# Altium footprint library Apalis Evaluation Board.PcbLib: 212 footprints (part 5 of 14)
Each footprint in its own frame and in the unit in brackets; x right, y up, seen from the top. Pads: shape width x height; smd on the part's side, far side on the other; paste and mask are expansions set on the pad; w line width, h text height; cw(c..) or ccw(c..) is an arc to the next point about the centre after c.
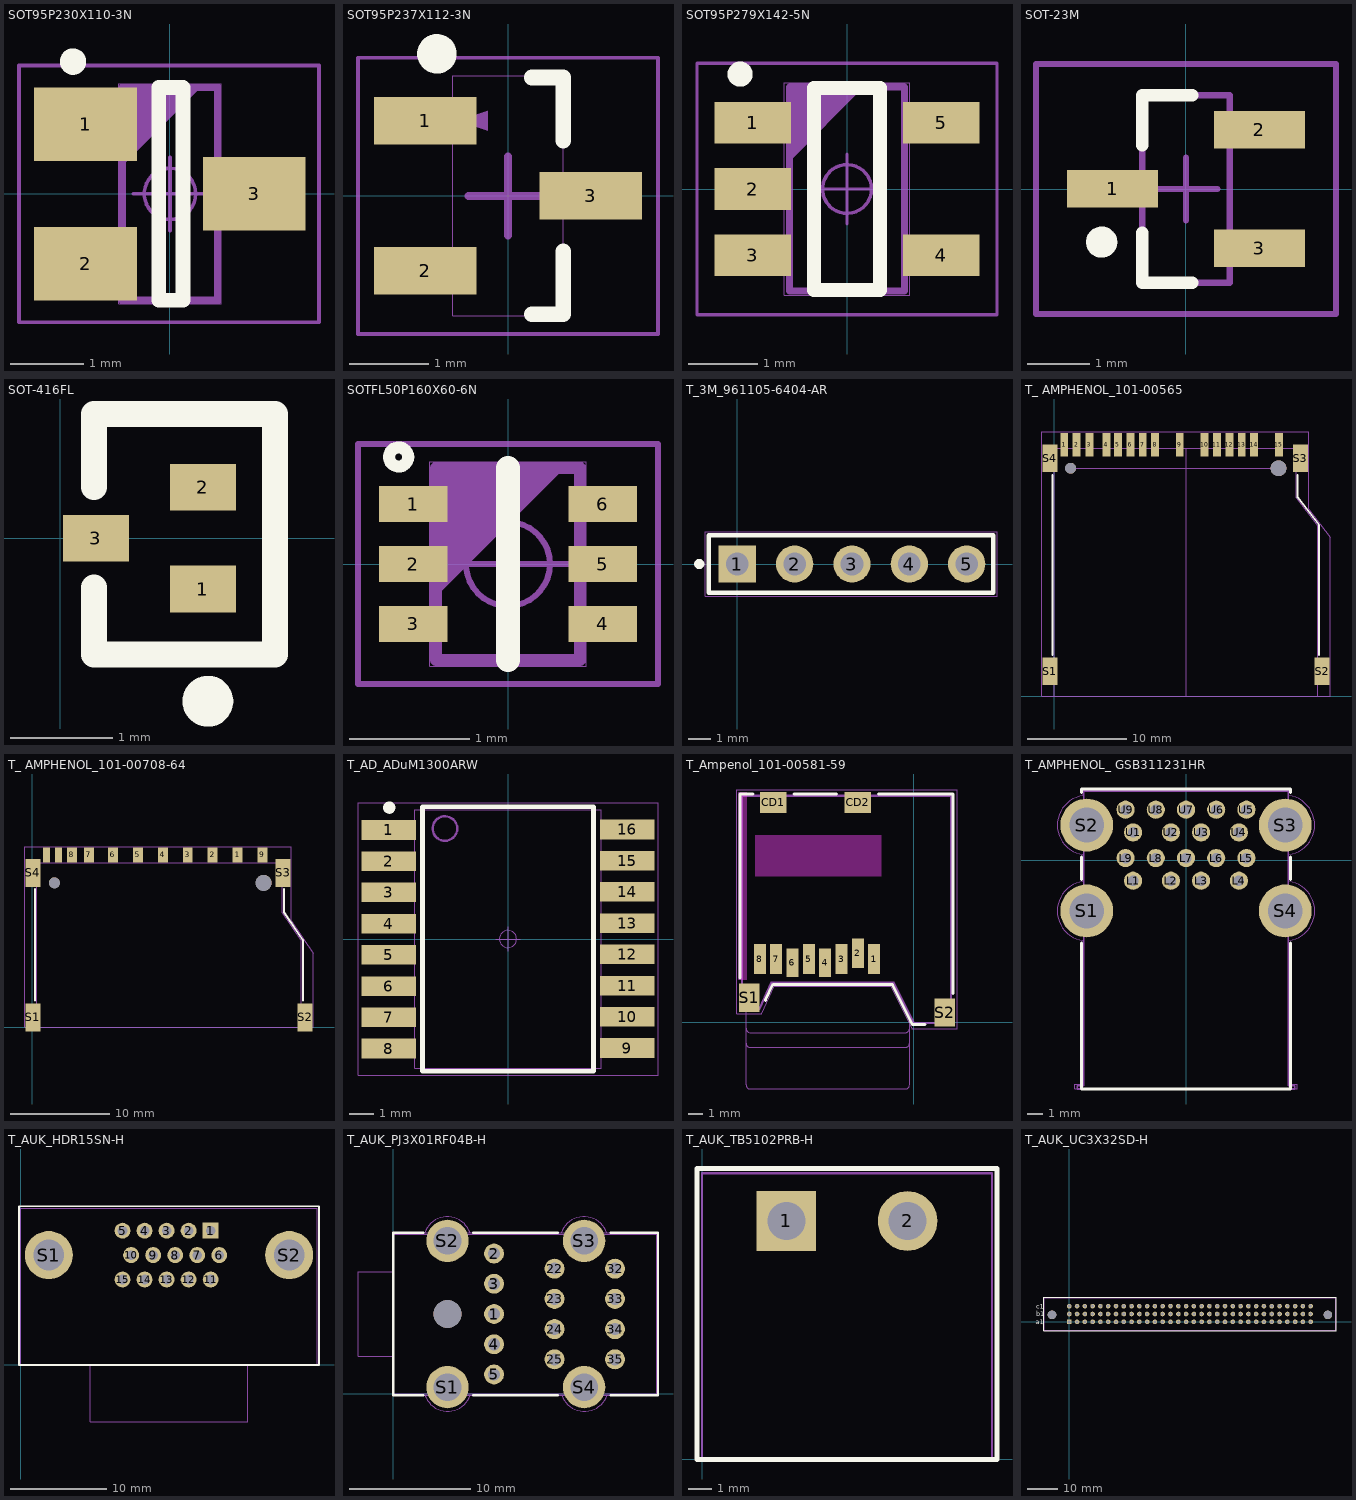
[diagram p4: the footprints below, top view; thin cyan lines are the x and y axes]

## SOT95P230X110-3N [mm] "SOT-23-3L"
height 1.12
pads (3):
  rect 1.4x1 smd: 1(-1.15,0.95) 2(-1.15,-0.95) 3(1.15,0)
Top Overlay:
  circle w0.2: c-1.321,1.803 r0.08
  lines w0.2: -0.152,-1.45 0.178,-1.45 0.178,1.45 -0.152,1.45 -0.152,-1.45
Mechanical 1:
  circle w0.05: c0,0 r0.35
  lines w0.05: -0.5,0 0.5,0 ; 0,-0.5 0,0.5 ; -2.057,-1.75 2.032,-1.75 2.032,1.75 -2.057,1.75 -2.057,-1.75
Mechanical 2:
  lines w0.001: -0.7,-1.5 0.7,-1.5 0.7,1.5 -0.7,1.5 -0.7,-1.5
Mechanical 3:
  lines w0.1: -0.65,0.45 0.35,1.45 ; -0.65,0.55 0.25,1.45 ; -0.65,0.65 0.15,1.45 ; -0.65,0.75 0.05,1.45 ; -0.65,0.85 -0.05,1.45 ; -0.65,0.95 -0.15,1.45 ; -0.65,1.05 -0.25,1.45 ; -0.65,1.15 -0.35,1.45 ; -0.65,1.25 -0.45,1.45 ; -0.65,1.35 -0.55,1.45 ; -0.65,-1.45 0.65,-1.45 0.65,1.45 -0.65,1.45 -0.65,-1.45
3D body: height 1.12, standoff 0, extent -0.7,-1.5 0.7,1.5

## SOT95P237X112-3N [mm] "SOT23, 3-Leads, Body 3.0x2.6mm (max), Pitch 0.95mm, IPC Medium Density"
height 1.12
pads (3):
  rect 1.3x0.6 smd: 1(-1.05,0.95) 2(-1.05,-0.95) 3(1.05,0)
Top Overlay:
  circle w0.25: c-0.9,1.8 r0.125
  lines w0.2: 0.3,-1.5 0.7,-1.5 0.7,-0.7 ; 0.3,1.5 0.7,1.5 0.7,0.7
Mechanical 1:
  lines w0.05: -1.9,-1.75 -1.9,1.75 1.9,1.75 1.9,-1.75 -1.9,-1.75
Mechanical 2:
  lines w0.001: -0.7,-1.52 0.7,-1.52 0.7,1.52 -0.7,1.52 -0.7,-1.52
Mechanical 3:
  region: -0.635,0.95 -0.254,1.077 -0.254,0.823
  lines w0.1: -0.5,0 0.5,0 ; 0,-0.5 0,0.5
3D body: height 1.12, standoff 0.2, extent -0.7,-1.52 0.7,1.52

## SOT95P279X142-5N [mm]
height 1.1
pads (5):
  rect 1.1x0.6 smd: 1(-1.35,0.95) 2(-1.35,0) 3(-1.35,-0.95) 4(1.35,-0.95) 5(1.35,0.95)
Top Overlay:
  circle w0.2: c-1.533,1.646 r0.08
  lines w0.2: -0.475,-1.45 0.475,-1.45 0.475,1.45 -0.475,1.45 -0.475,-1.45
Mechanical 1:
  circle w0.05: c0,0 r0.35
  lines w0.05: -0.5,0 0.5,0 ; 0,-0.5 0,0.5 ; -2.15,-1.8 2.15,-1.8 2.15,1.8 -2.15,1.8 -2.15,-1.8
Mechanical 2:
  lines w0.001: -0.9,-1.52 0.9,-1.52 0.9,1.52 -0.9,1.52 -0.9,-1.52
Mechanical 3:
  lines w0.1: -0.825,0.46 0.175,1.46 ; -0.825,0.56 0.075,1.46 ; -0.825,0.66 -0.025,1.46 ; -0.825,0.76 -0.125,1.46 ; -0.825,0.86 -0.225,1.46 ; -0.825,0.96 -0.325,1.46 ; -0.825,1.06 -0.425,1.46 ; -0.825,1.16 -0.525,1.46 ; -0.825,1.26 -0.625,1.46 ; -0.825,1.36 -0.725,1.46 ; -0.825,-1.46 0.825,-1.46 0.825,1.46 -0.825,1.46 -0.825,-1.46
3D body: height 1.1, standoff 0, extent -0.9,-1.52 0.9,1.52

## SOT-23M [mm]
pads (3):
  rect 1.45x0.6 smd: 1(-1.175,0) 2(1.175,0.95) 3(1.175,-0.95)
Top Overlay:
  circle w0.25: c-1.35,-0.85 r0.125
  lines w0.2: -0.7,-0.7 -0.7,-1.5 0.1,-1.5 ; -0.7,0.7 -0.7,1.5 0.1,1.5
Mechanical 13:
  lines w0.1: -0.7,-1.5 -0.7,1.5 0.7,1.5 0.7,-1.5 -0.7,-1.5
Mechanical 15:
  lines w0.1: -0.5,0 0.5,0 ; 0,-0.5 0,0.5 ; -2.4,-2 -2.4,2 2.4,2 2.4,-2 -2.4,-2
3D body: height 1.1, standoff 0, extent -0.7,-1.5 0.7,1.5

## SOT-416FL [mm] "DTC043ZEBTL"
height 0.85
pads (3):
  rect 0.65x0.46 smd: 1(1.4,-0.5) 2(1.4,0.5) 3(0.35,0)
Top Overlay:
  circle w0.25: c1.448,-1.6 r0.125
  lines w0.254: 0.33,-0.483 0.33,-1.143 2.108,-1.143 2.108,1.219 0.33,1.219 0.33,0.5

## SOTFL50P160X60-6N [mm] "SOT-563"
height 0.6
pads (6):
  rect 0.57x0.3 smd: 1(-0.79,0.5) 2(-0.79,0) 3(-0.79,-0.5) 4(0.79,-0.5) 5(0.79,0) 6(0.79,0.5)
Top Overlay:
  circle w0.1: c-0.911,0.892 r0.08
  lines w0.2: 0,-0.8 0,0.8
Mechanical 1:
  circle w0.05: c0,0 r0.35
  lines w0.05: -0.5,0 0.5,0 ; 0,-0.5 0,0.5 ; -1.25,-1 -1.25,1 1.25,1 1.25,-1 -1.25,-1
Mechanical 2:
  lines w0.001: -0.65,-0.85 -0.65,0.85 0.65,0.85 0.65,-0.85 -0.65,-0.85
Mechanical 3:
  lines w0.1: -0.6,-0.2 0.4,0.8 ; -0.6,-0.1 0.3,0.8 ; -0.6,0 0.2,0.8 ; -0.6,0.1 0.1,0.8 ; -0.6,0.2 0,0.8 ; -0.6,0.3 -0.1,0.8 ; -0.6,0.4 -0.2,0.8 ; -0.6,0.5 -0.3,0.8 ; -0.6,0.6 -0.4,0.8 ; -0.6,0.7 -0.5,0.8 ; -0.6,-0.8 -0.6,0.8 0.6,0.8 0.6,-0.8 -0.6,-0.8
3D body: height 0.6, standoff 0, extent -0.65,-0.85 0.65,0.85

## T_3M_961105-6404-AR [mm] "Connector; Header; 35 Position"
height 8.4
pads (5):
  rect 1.65x1.65 hole 1: 1(0,0)
  round 1.65 hole 1: 2(2.54,0) 3(5.08,0) 4(7.62,0) 5(10.16,0)
Top Overlay:
  circle w0.25: c-1.687,0 r0.1
  lines w0.2: -1.27,-1.27 -1.27,1.27 11.344,1.27 11.344,-1.27 -1.27,-1.27
Mechanical 1:
  lines w0.05: -1.43,-1.43 11.504,-1.43 11.504,1.43 -1.43,1.43 -1.43,-1.43
Mechanical 2:
  lines w0.001: -1.27,-1.27 -1.27,1.27 11.344,1.27 11.344,-1.27 -1.27,-1.27
Mechanical 3:
  lines w0.1: -1.27,-1.27 -1.27,1.27 11.344,1.27 11.344,-1.27 -1.27,-1.27
3D body "Samtec-TSW-105-07-G-S, Jumper with 5 pins, male.step": height 8.4, standoff -2.52, extent -1.27,-1.27 11.43,1.27

## T_ AMPHENOL_101-00565 [mm] "SD/MMC 8bit Card Holder"
height 2.85
pads (21):
  rect 0.8x2.35 smd: 1(1,25.375) 2(2.25,25.375) 3(3.55,25.375) 4(5.25,25.375) 5(6.43,25.375) 6(7.68,25.375) 7(8.93,25.375) 8(10.18,25.375) 9(12.67,25.375) 10(15.18,25.375) 11(16.43,25.375) 12(17.68,25.375) 13(18.93,25.375) 14(20.18,25.375) 15(22.68,25.375)
  rect 1.5x2.8 smd: S1(-0.45,2.5) S2(27.05,2.5) S3(24.86,24) S4(-0.45,24)
  round 1.1 hole 1.1 unplated: ""(1.65,23)
  round 1.6 hole 1.6 unplated: ""(22.65,23)
Top Overlay:
  lines w0.2: -0.2,4.125 -0.2,22.345 ; 24.575,22.345 24.575,20.055 26.755,17.268 26.755,4.125
Mechanical 1:
  lines w0.05: -1.29,0 -1.29,26.665 25.7,26.665 25.7,18.856 27.89,16.056 27.89,0 -1.29,0
Mechanical 2:
  lines w0.01: 0,1.5 -0.7,1.5 -0.7,3.5 0,3.5 ; 0,23 -0.7,23 -0.7,25 -0.11,25 24.41,25 ; 0,25 0,0 26.6,0 26.6,17.2 24.41,20 24.41,25 ; 1.65,23 22.65,23 ; 13.3,0 13.3,25 ; 24.41,23 25.11,23 25.11,25 24.41,25 ; 26.6,1.5 27.3,1.5 27.3,3.5 26.6,3.5
Mechanical 3:
  lines w0.1: 0,0 26.6,0 26.6,17.2 24.41,20 24.41,25 0,25 0,0
3D body: height 0.6, standoff 0, extent 24.41,23 25.11,25
3D body: height 0.6, standoff 0, extent -0.7,1.5 0,3.5
3D body: height 0.6, standoff 0, extent 26.6,1.5 27.3,3.5
3D body: height 3.45, standoff 0, extent 0,0 26.6,25
3D body: height 0.6, standoff 0, extent -0.7,23 0,25

## T_ AMPHENOL_101-00708-64 [mm] "SD/MMC Card Holder"
height 2.85
pads (17):
  rect 1x1.5 smd: 1(20.59,17.3) 2(18.09,17.3) 3(15.59,17.3) 4(13.09,17.3) 5(10.59,17.3) 6(8.09,17.3) 7(5.67,17.3) 8(3.97,17.3) 9(23.09,17.3)
  rect 0.7x1.5 smd: 10(2.63,17.3) 11(1.43,17.3)
  rect 1.5x2.8 smd: S1(0.06,1) S2(27.36,1) S3(25.16,15.5) S4(0.06,15.5)
  round 1.1 hole 1.1 unplated: ""(2.21,14.5)
  round 1.6 hole 1.6 unplated: ""(23.21,14.5)
Top Overlay:
  lines w0.2: 0.25,2.68 0.25,13.88 ; 25.255,13.88 25.255,11.552 27.14,8.759 27.14,2.68
Mechanical 1:
  lines w0.05: -0.775,0 28.195,0 28.195,7.45 26,10.702 26,18.125 -0.775,18.125 -0.775,0
Mechanical 2:
  lines w0.001: 0.45,0 0,0 0,2 0.45,2 ; 0.45,14.5 0,14.5 0,16.5 0.45,16.5 ; 25.08,14.5 25.5,14.5 25.5,16.5 25.08,16.5 ; 26.97,0 27.39,0 27.39,2 26.97,2
  lines w0.01: 0.45,0 0.45,16.5 25.08,16.5 25.08,11.5 26.97,8.7 26.97,0 0.45,0
Mechanical 3:
  lines w0.1: 0.45,0 26.97,0 26.97,8.7 25.08,11.5 25.08,16.5 0.45,16.5 0.45,0
3D body: height 0.6, standoff 0, extent 26.97,0 27.39,2
3D body: height 0.6, standoff 0, extent 0,0 0.45,2
3D body: height 0.6, standoff 0, extent 0,14.5 0.45,16.5
3D body: height 0.6, standoff 0, extent 25.08,14.5 25.5,16.5
3D body: height 2.85, standoff 0, extent 0.45,0 26.97,16.5

## T_AD_ADuM1300ARW [mm] "SOIC _W 16 pin"
height 2.65
pads (16):
  rect 2.2x0.8 smd: 1(-4.85,4.435) 2(-4.85,3.165) 3(-4.85,1.895) 4(-4.85,0.625) 5(-4.85,-0.645) 6(-4.85,-1.915) 7(-4.85,-3.185) 8(-4.85,-4.455) 9(4.85,-4.435) 10(4.85,-3.165) 11(4.85,-1.895) 12(4.85,-0.625) 13(4.85,0.645) 14(4.85,1.915) 15(4.85,3.185) 16(4.85,4.455)
Top Overlay:
  circle w0.25: c-4.829,5.343 r0.125
  lines w0.2: 3.481,-5.378 -3.481,-5.378 -3.481,5.377 3.481,5.377 3.481,-5.377
Mechanical 1:
  circle w0.05: c0,0 r0.35
  lines w0.05: -0.5,0 0.5,0 ; 0,-0.5 0,0.5 ; -6.1,-5.536 -6.1,5.535 6.1,5.535 6.1,-5.536 -6.1,-5.536
Mechanical 2:
  lines w0.001: -3.8,-5.25 3.8,-5.25 3.8,5.25 -3.8,5.25 -3.8,-5.25
Mechanical 3:
  circle w0.1: c-2.565,4.493 r0.5
  lines w0.1: -3.481,-5.378 3.481,-5.378 3.481,5.377 -3.481,5.377 -3.481,-5.378
3D body: height 2.65, standoff 0, extent -3.8,-5.25 3.8,5.25

## T_Ampenol_101-00581-59 [mm] "MicroSD Holder top-loading type"
height 1.8
pads (12):
  rect 0.8x2 smd: 1(-2.67,4.25) 2(-3.77,4.65) 3(-4.87,4.25) 5(-7.07,4.25) 7(-9.27,4.25) 8(-10.37,4.25)
  rect 0.8x1.9 smd: 4(-5.97,4) 6(-8.17,4)
  rect 1.8x1.4 smd: CD1(-9.47,14.8) CD2(-3.77,14.8)
  rect 1.4x1.9 smd: S1(-11.08,1.65) S2(2.08,0.65)
Top Overlay:
  lines w0.2: -11.697,2.96 -11.697,15.366 -10.839,15.366 ; -9.998,1.461 -9.496,2.549 -1.448,2.549 -0.105,-0.167 0.753,-0.167 ; -8.055,15.366 -5.197,15.366 ; -2.39,15.366 2.636,15.366 2.636,1.928
Keep-Out Layer:
  rectangle: -11.83,2.854 -11.23,15.5
  rectangle: -10.68,9.8 -2.18,12.6
Mechanical 1:
  lines w0.05: -11.916,0.564 -10.253,0.564 -9.403,2.407 -1.54,2.407 -0.135,-0.436 2.916,-0.436 2.916,15.636 -11.916,15.636 -11.916,0.564
Mechanical 2:
  lines w0.001: -11.29,-1.425 ccw(c-11.015,-1.425) -11.015,-1.7 -0.565,-1.7 ccw(c-0.565,-1.425) -0.29,-1.425 ; -11.29,-0.428 -11.29,-4.225 ccw(c-11.015,-4.225) -11.015,-4.5 -0.565,-4.5 ccw(c-0.565,-4.225) -0.29,-4.225 -0.29,-0.425 ; -11.29,0.95 -11.29,-0.425 ccw(c-11.015,-0.425) -11.015,-0.7 -0.565,-0.7 ccw(c-0.565,-0.425) -0.29,-0.425 ; -0.29,0.586 -0.29,-0.425 ; -11.53,0.95 -11.53,15.2 2.47,15.2 2.47,0 0,0 -1.346,2.721 -9.608,2.721 -10.424,0.95 -11.53,0.95
Mechanical 3:
  lines w0.1: -10.38,0.876 -11.596,0.876 -11.596,15.266 2.529,15.266 ; -10.379,0.878 -9.563,2.649 ; -9.56,2.649 -1.384,2.649 ; -1.383,2.649 -0.041,-0.066 ; -0.038,-0.068 2.538,-0.068 ; 2.535,-0.045 2.535,15.265 2.529,15.265 ; 2.529,15.265 2.529,15.266

## T_AMPHENOL_ GSB311231HR [mm] "USB 3.0 double row, Type A"
height 15.5
pads (22):
  round 1.2 hole 0.7: L1(-3.5,-1.35) L2(-1,-1.35) L3(1,-1.35) L4(3.5,-1.35) L5(4,0.15) L6(2,0.15) L7(0,0.15) L8(-2,0.15) L9(-4,0.15) U1(-3.5,1.85) U2(-1,1.85) U3(1,1.85) U4(3.5,1.85) U5(4,3.35) U6(2,3.35) U7(0,3.35) U8(-2,3.35) U9(-4,3.35)
  round 3.5 hole 2.3: S1(-6.57,-3.35) S2(-6.57,2.33) S3(6.57,2.33) S4(6.57,-3.35)
Top Overlay:
  lines w0.2: -6.9,-5.48 -6.9,-15.13 6.9,-15.13 6.9,-5.48 ; -6.9,-1.28 -6.9,0.22 ; -6.9,4.5 -6.9,4.72 6.9,4.72 6.9,4.5 ; 6.9,-1.28 6.9,0.22
Mechanical 1:
  lines w0.05: -6.809,-5.293 -6.809,-14.83 -7.349,-14.83 -7.349,-15.13 7.349,-15.13 7.349,-14.83 6.81,-14.83 6.809,-5.292 ; -6.809,-1.405 -6.809,0.385 ; -6.809,-5.293 cw(c-6.565,-3.351) -6.809,-1.408 ; -6.809,0.387 cw(c-6.565,2.329) -6.809,4.272 -6.809,4.63 6.809,4.63 6.809,4.273 ; 6.809,-5.292 ccw(c6.565,-3.349) 6.809,-1.407 ; 6.809,0.388 ccw(c6.565,2.331) 6.809,4.273 ; 6.809,-1.405 6.809,0.385
Mechanical 2:
  lines w0.001: -6.753,4.57 6.747,4.57 ; -6.75,4.57 -6.75,-14.93 -7.2,-14.93 -7.2,-15.13 7.2,-15.13 7.2,-14.93 6.75,-14.93 6.75,4.57
Mechanical 3:
  lines w0.1: -7.2,-15.13 -7.2,-14.93 -6.75,-14.93 -6.75,4.57 6.75,4.57 6.75,-14.93 7.2,-14.93 7.2,-15.13 -7.2,-15.13

## T_AUK_HDR15SN-H [mm] "15 pin male D-SUB connector"
height 12.55
pads (17):
  rect 1.65x1.65 hole 1: 1(19.73,13.97)
  round 1.65 hole 1: 2(17.44,13.97) 3(15.15,13.97) 4(12.86,13.97) 5(10.57,13.97) 6(20.62,11.43) 7(18.33,11.43) 8(16.04,11.43) 9(13.75,11.43) 10(11.46,11.43) 11(19.73,8.89) 12(17.44,8.89) 13(15.15,8.89) 14(12.86,8.89) 15(10.57,8.89)
  round 5 hole 3.2: S1(2.9,11.43) S2(27.9,11.43)
Top Overlay:
  lines w0.2: -0.2,0 -0.2,16.505 31,16.505 31,0 -0.2,0
Mechanical 1:
  lines w0.05: 0,0 0,16.3 30.8,16.3 30.8,0 0,0
Mechanical 2:
  lines w0.001: 7.235,0 7.235,-5.9 23.565,-5.9 23.565,0 ; 30.8,0 30.8,16.3 0,16.3 0,0 30.819,0
Mechanical 3:
  lines w0.1: 0,0 30.8,0 30.8,16.3 0,16.3 0,0
3D body "VGA connector_mod2.STEP": height 12.6, standoff -3.17, extent -0.006,-5.893 30.81,16.231

## T_AUK_PJ3X01RF04B-H [mm] "Audio Jack Triple Stacked DIP Type"
height 37
pads (18):
  round 1.65 hole 1: 1(8.35,6.6) 2(8.35,11.6) 3(8.35,9.1) 4(8.35,4.1) 5(8.35,1.6) 22(13.35,10.35) 23(13.35,7.85) 24(13.35,5.35) 25(13.35,2.85) 32(18.35,10.35) 33(18.35,7.85) 34(18.35,5.35) 35(18.35,2.85)
  round 3.5 hole 2.3: S1(4.5,0.55) S2(4.5,12.65) S3(15.8,12.65) S4(15.8,0.55)
  round 2.3 hole 2.3 unplated: ""(4.5,6.6)
Top Overlay:
  lines w0.2: 0,-0.105 2.5,-0.105 ; 0,-0.082 0,13.305 2.5,13.305 ; 6.625,-0.105 13.625,-0.105 ; 6.625,13.305 13.625,13.305 ; 18,-0.105 21.903,-0.105 21.905,-0.105 21.905,13.305 18,13.305
Mechanical 1:
  lines w0.05: 2.604,13.299 cw(c4.484,12.666) 6.363,13.301 ; 2.604,13.3 0,13.3 0,-0.1 2.637,-0.1 ; 2.637,-0.101 ccw(c4.516,0.533) 6.396,-0.099 ; 6.363,13.3 13.904,13.3 ; 6.396,-0.1 13.937,-0.1 ; 13.904,13.299 cw(c15.784,12.666) 17.663,13.301 ; 13.937,-0.101 ccw(c15.816,0.533) 17.696,-0.099 ; 17.663,13.3 21.9,13.3 21.9,-0.1 17.696,-0.1
Mechanical 2:
  lines w0.001: 0,3.1 -2.9,3.1 -2.9,10.1 0,10.1 ; 0,0 0,13.2 21.8,13.2 21.8,0 0,0
Mechanical 3:
  lines w0.1: 0,-0.1 21.901,-0.1 ; 0,13.3 21.9,13.3 21.902,13.298 21.902,-0.1 ; 0.001,-0.074 0.001,13.326 ; 21.901,-0.1 21.902,-0.1
3D body: height 31.5, standoff 28.5, extent -2.905,5.105 0.01,8.093
3D body: height 19, standoff 16, extent -2.905,5.105 0.01,8.093
3D body: height 6.5, standoff 3.5, extent -2.905,5.105 0.01,8.093
3D body: height 21.01, standoff 13.99, extent -2.9,3.1 0,10.1
3D body: height 33.51, standoff 26.49, extent -2.9,3.1 0,10.1
3D body: height 8.51, standoff 1.49, extent -2.9,3.1 0,10.1
3D body: height 38.5, standoff 0, extent 0,0 21.8,13.2

## T_AUK_TB5102PRB-H [mm] "Power Connector 5.08mm pitch"
height 8.4
pads (2):
  rect 2.5x2.5 hole 1.6: 1(3.54,10)
  round 2.5 hole 1.6: 2(8.62,10)
Top Overlay:
  lines w0.2: -0.21,0 -0.21,12.2 12.37,12.2 12.37,0 -0.21,0
Mechanical 1:
  lines w0.05: 0,0 0,12 12.16,12 12.16,0 0,0
Mechanical 2:
  lines w0.001: 0,0 0,12 12.16,12 12.16,0 0,0
Mechanical 3:
  lines w0.1: 0,0 0,12 12.16,12 12.16,0 0,0
3D body "c-796638-2-c3-3d.stp": height 8.37, standoff -3.48, extent -0.16,0 11.82,12

## T_AUK_UC3X32SD-H [mm] "Header, 3x32 Pins, 2.54 mm pitch"
height 11.6
pads (98):
  rect 1.5x1.5 hole 1: A1(0,0)
  round 1.5 hole 1: A2(2.54,0) A3(5.08,0) A4(7.62,0) A5(10.16,0) A6(12.7,0) A7(15.24,0) A8(17.78,0) A9(20.32,0) A10(22.86,0) A11(25.4,0) A12(27.94,0) A13(30.48,0) A14(33.02,0) A15(35.56,0) A16(38.1,0) A17(40.64,0) A18(43.18,0) A19(45.72,0) A20(48.26,0) A21(50.8,0) A22(53.34,0) A23(55.88,0) A24(58.42,0) A25(60.96,0) A26(63.5,0) A27(66.04,0) A28(68.58,0) A29(71.12,0) A30(73.66,0) A31(76.2,0) A32(78.74,0) B1(0,2.54) B2(2.54,2.54) B3(5.08,2.54) B4(7.62,2.54) B5(10.16,2.54) B6(12.7,2.54) B7(15.24,2.54) B8(17.78,2.54) B9(20.32,2.54) B10(22.86,2.54) B11(25.4,2.54) B12(27.94,2.54) B13(30.48,2.54) B14(33.02,2.54) B15(35.56,2.54) B16(38.1,2.54) B17(40.64,2.54) B18(43.18,2.54) B19(45.72,2.54) B20(48.26,2.54) B21(50.8,2.54) B22(53.34,2.54) B23(55.88,2.54) B24(58.42,2.54) B25(60.96,2.54) B26(63.5,2.54) B27(66.04,2.54) B28(68.58,2.54) B29(71.12,2.54) B30(73.66,2.54) B31(76.2,2.54) B32(78.74,2.54) C1(0,5.08) C2(2.54,5.08) C3(5.08,5.08) C4(7.62,5.08) C5(10.16,5.08) C6(12.7,5.08) C7(15.24,5.08) C8(17.78,5.08) C9(20.32,5.08) C10(22.86,5.08) C11(25.4,5.08) C12(27.94,5.08) C13(30.48,5.08) C14(33.02,5.08) C15(35.56,5.08) C16(38.1,5.08) C17(40.64,5.08) C18(43.18,5.08) C19(45.72,5.08) C20(48.26,5.08) C21(50.8,5.08) C22(53.34,5.08) C23(55.88,5.08) C24(58.42,5.08) C25(60.96,5.08) C26(63.5,5.08) C27(66.04,5.08) C28(68.58,5.08) C29(71.12,5.08) C30(73.66,5.08) C31(76.2,5.08) C32(78.74,5.08)
  round 2.8 hole 2.8 unplated: ""(-5.63,2.24) ""(84.37,2.24)
Top Overlay:
  lines w0.2: -8.255,-2.885 -8.255,7.963 86.995,7.963 86.995,-2.885 -8.255,-2.885
  text "a1" at -10.847,-0.758 h1.52
  text "b1" at -10.84,1.778 h1.52
  text "c1" at -10.84,4.318 h1.52
Mechanical 1:
  lines w0.05: -8.205,-2.835 86.945,-2.835 86.945,7.915 -8.205,7.915 -8.205,-2.835
Mechanical 2:
  lines w0.001: -8.13,-2.71 86.87,-2.71 86.87,7.79 -8.13,7.79 -8.13,-2.71
Mechanical 3:
  lines w0.1: -8.13,-2.76 -8.13,7.84 86.87,7.84 86.87,-2.76 -8.13,-2.76
3D body "14279.stp": height 11.62, standoff -3.98, extent -8.13,-2.76 86.87,7.84